# Altium footprint library RX8 GPS engine.PcbLib: 24 footprints (part 2 of 2)
Each footprint in its own frame and in the unit in brackets; x right, y up, seen from the top. Pads: shape width x height; smd on the part's side, far side on the other; paste and mask are expansions set on the pad; w line width, h text height; cw(c..) or ccw(c..) is an arc to the next point about the centre after c.
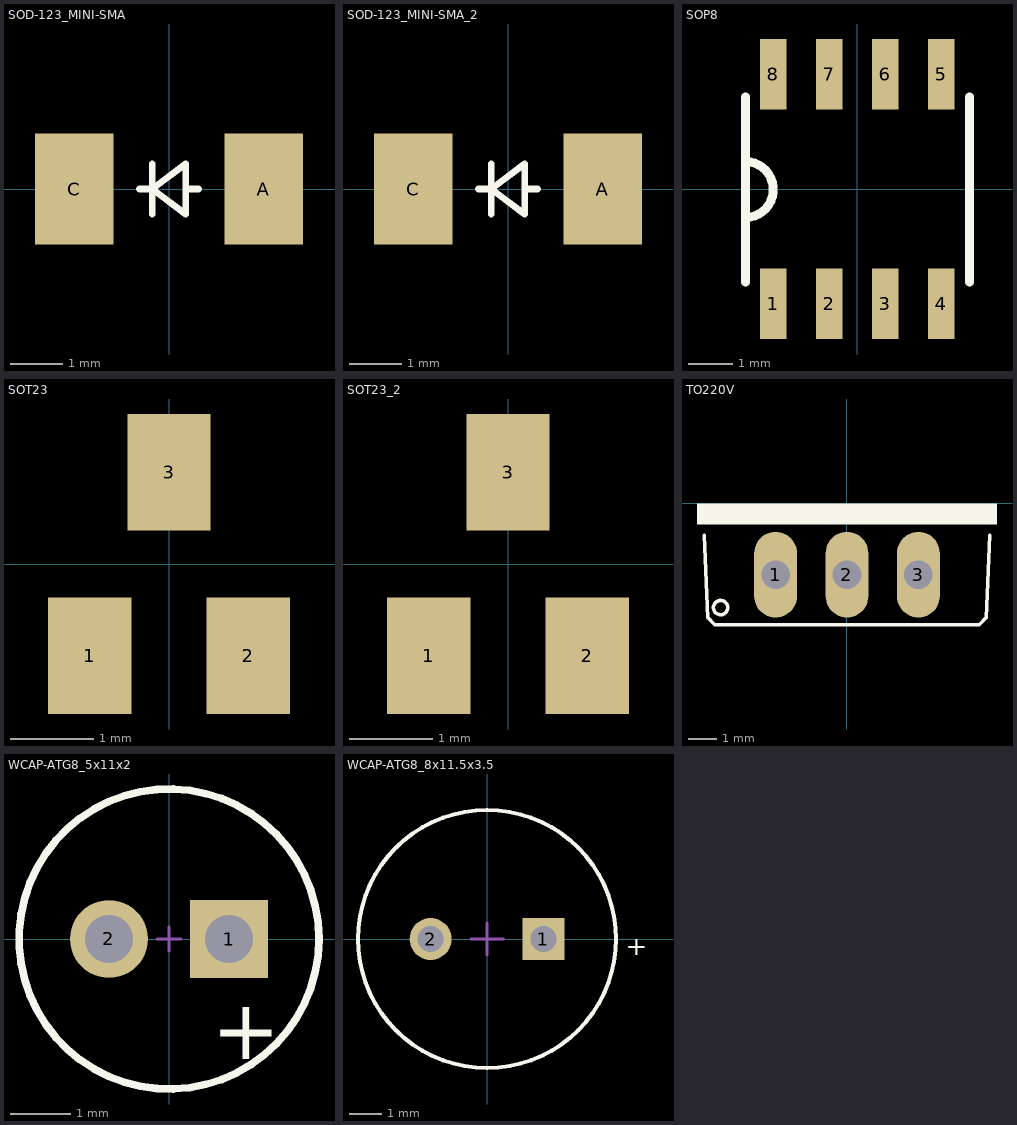
[diagram p1: the footprints below, top view; thin cyan lines are the x and y axes]

## SOD-123_MINI-SMA [mil] "SOD-123_MINI-SMA"
pads (2):
  rect 59.06x82.68 smd: A(70.87,0) C(-70.87,0)
Top Overlay:
  lines w5: -22.1,0 -12.5,0 ; -12.5,-18.75 -12.5,0 ; -12.5,18.75 -12.5,0 ; 22.1,0 12.5,0 ; -12.5,0 12.5,18.75 12.5,0 ; -12.5,0 12.5,-18.75 12.5,0
3D body "SOD-123FL.STEP": height 53.15, standoff 0, extent -70.79,-39.77 80.79,45

## SOD-123_MINI-SMA_2 [mil]
pads (2):
  rect 59.06x82.68 smd: A(70.87,0) C(-70.87,0)
Top Overlay:
  lines w5: -22.1,0 -12.5,0 ; -12.5,-18.75 -12.5,0 ; -12.5,18.75 -12.5,0 ; 22.1,0 12.5,0 ; -12.5,0 12.5,-18.75 12.5,0 ; -12.5,0 12.5,18.75 12.5,0
3D body "SOD-123FL.STEP": height 53.15, standoff 0, extent -70.79,-39.77 80.79,45

## SOP8 [mil] "SOP8"
pads (8):
  rect 23.62x62.99 smd: 1(-75,-102.36) 2(-25,-102.36) 3(25,-102.36) 4(75,-102.36) 5(75,102.36) 6(25,102.36) 7(-25,102.36) 8(-75,102.36)
Top Overlay:
  lines w8: -100,-83.07 -100,82.09 ; -100,-25.49 ccw(c-100,-0.49) -100,24.51 ; 100,-83.07 100,82.09
3D body "SOIC8.STEP": height 62.99, standoff 0, extent -94.37,-118.11 95,118.11

## SOT23 [mm] "SOT23"
pads (3):
  rect 1x1.4 smd: 1(-0.95,-1.1) 2(0.95,-1.1) 3(0,1.1)
3D body "SOT23.STEP": height 1.15, standoff 0, extent -1.524,-1.265 1.576,1.265

## SOT23_2 [mm]
pads (3):
  rect 1x1.4 smd: 1(-0.95,-1.1) 2(0.95,-1.1) 3(0,1.1)
3D body "SOT23.STEP": height 1.15, standoff 0, extent -1.524,-1.265 1.576,1.265

## TO220V [mil] "TO220V"
pads (3):
  oval 60x120 hole 40: 1(-100,-100) 2(0,-100) 3(100,-100)
Top Overlay:
  circle w5: c-177,-146 r10
  rectangle: -210,-30 210,0
  lines w5: -200,-45 -195,-160 -185,-170 185,-170 195,-160 200,-45
Mechanical 18:
  text "3" at 107.43,-75.94 h77.5
  text "2" at 13.84,-41.94 h77.5
  text "1" at -106.7,-75.1 h77.5
3D body "TO-220 3pins short V1.stp": height 752.23, standoff -118.11, extent -233.93,-168.89 233.95,4.34

## WCAP-ATG8_5x11x2 [mm] "Aluminum Electrolytic Capacitors, 5x11mm"
height 11
pads (2):
  rect 1.3x1.3 hole 0.8: 1(1,0)
  round 1.3 hole 0.8: 2(-1,0)
Top Overlay:
  circle w0.127: c0,0 r2.5
  text "+" at 0.711,-2.008 h1
Mechanical 13:
  circle w0.1: c0,0 r2.5
Mechanical 15:
  lines w0.05: -0.2,0 0.2,0 ; 0,-0.2 0,0.2
3D body "5x11x2x0.5.stp": height 11.31, standoff -19.91, extent -2.49,-2.5 2.5,2.5

## WCAP-ATG8_8x11.5x3.5 [mm] "Aluminum Electrolytic Capacitors, 8x11.5mm"
height 11.5
pads (2):
  rect 1.3x1.3 hole 0.8: 1(1.75,0)
  round 1.3 hole 0.8: 2(-1.75,0)
Top Overlay:
  circle w0.127: c0,0 r4
  text "+" at 4.3,-0.7 h1
Mechanical 13:
  circle w0.1: c0,0 r4
Mechanical 15:
  lines w0.1: -0.5,0 0.5,0 ; 0,-0.5 0,0.5
3D body "8x11.5x3.5x0.5.stp": height 11.81, standoff -19.91, extent -3.99,-4 4,3.999